# Altium integrated library Rosenberger HSD.IntLib: 118 symbols (part 1 of 2) (continued)
## D4S12H-40MA5-B-EMITTER (continued)
HSD Straight Plug, Pin in Paste, Coding B (White), Up to 5 GBit/s Per Pair, Emitter Side; PartNumber: D4S12H-40MA5-B-EMITTER; Design Note 1: Footprint in library is a generic example - only application specific footprint delivers High Performance; Design Note 2: A HSD 1-to-1 connection always needs an Emitter AND Receiver symbol, because the cable has a A->B direction, the pinning must be crossed.; DatasheetVersion: a00; PackageVersion: a00; PackageReference: D4S12H-40MA5-B; PackageDescription: HSD Straight Plug, 12 x 14.15 x 15.45 mm; Coding: B (White); Mounting Technology: Pin-in-Paste; ComponentLink1Description: Manufacturer URL; ComponentLink1URL: http://www.rosenberger.de; ComponentLink2Description: Datasheet; ComponentLink2URL: http://rosenberger.de/ok/images/documents/db/D4S12H-40MA5-Y.pdf; ComponentLink3Description: Package Specification; ComponentLink3URL: http://rosenberger.de/ok/images/documents/db/D4S12H-40MA5-Y.pdf; ComponentLink4Description: Series Overview / Design Note; ComponentLink4URL: http://rosenberger.de/ok/images/documents/spez/hsd.pdf; ComponentLink5Description: Webshop / RFQ; ComponentLink5URL: http://www.rosenberger.com/en/contact/sales/
footprint ROS-D4S12H-40MA5-B_V (HSD Straight Plug, 12x14.15x15.45mm, Rosenberger Recommended)
pins: 1, 2, 3, 4, MH
text: Pair A; Pair B

## D4S12H-40MA5-B-RECEIVER
designator P?
HSD Straight Plug, Pin in Paste, Coding B (White), Up to 5 GBit/s Per Pair, Receiver Side; PartNumber: D4S12H-40MA5-B-RECEIVER; Design Note 1: Footprint in library is a generic example - only application specific footprint delivers High Performance; Design Note 2: A HSD 1-to-1 connection always needs an Emitter AND Receiver symbol, because the cable has a A->B direction, the pinning must be crossed.; DatasheetVersion: a00; PackageVersion: a00; PackageReference: D4S12H-40MA5-B; PackageDescription: HSD Straight Plug, 12 x 14.15 x 15.45 mm; Coding: B (White); Mounting Technology: Pin-in-Paste; ComponentLink1Description: Manufacturer URL; ComponentLink1URL: http://www.rosenberger.de; ComponentLink2Description: Datasheet; ComponentLink2URL: http://rosenberger.de/ok/images/documents/db/D4S12H-40MA5-Y.pdf; ComponentLink3Description: Package Specification; ComponentLink3URL: http://rosenberger.de/ok/images/documents/db/D4S12H-40MA5-Y.pdf; ComponentLink4Description: Series Overview / Design Note; ComponentLink4URL: http://rosenberger.de/ok/images/documents/spez/hsd.pdf; ComponentLink5Description: Webshop / RFQ; ComponentLink5URL: http://www.rosenberger.com/en/contact/sales/
footprint ROS-D4S12H-40MA5-B_V (HSD Straight Plug, 12x14.15x15.45mm, Rosenberger Recommended)
pins: 1, 2, 3, 4, MH
text: Pair A; Pair B

## D4S12H-40MA5-C-EMITTER
designator P?
HSD Straight Plug, Pin in Paste, Coding C (Blue), Up to 5 GBit/s Per Pair, Emitter Side; PartNumber: D4S12H-40MA5-C-EMITTER; Design Note 1: Footprint in library is a generic example - only application specific footprint delivers High Performance; Design Note 2: A HSD 1-to-1 connection always needs an Emitter AND Receiver symbol, because the cable has a A->B direction, the pinning must be crossed.; DatasheetVersion: a00; PackageVersion: a00; PackageReference: D4S12H-40MA5-C; PackageDescription: HSD Straight Plug, 12 x 14.15 x 15.45 mm; Coding: C (Blue); Mounting Technology: Pin-in-Paste; ComponentLink1Description: Manufacturer URL; ComponentLink1URL: http://www.rosenberger.de; ComponentLink2Description: Datasheet; ComponentLink2URL: http://rosenberger.de/ok/images/documents/db/D4S12H-40MA5-Y.pdf; ComponentLink3Description: Package Specification; ComponentLink3URL: http://rosenberger.de/ok/images/documents/db/D4S12H-40MA5-Y.pdf; ComponentLink4Description: Series Overview / Design Note; ComponentLink4URL: http://rosenberger.de/ok/images/documents/spez/hsd.pdf; ComponentLink5Description: Webshop / RFQ; ComponentLink5URL: http://www.rosenberger.com/en/contact/sales/
footprint ROS-D4S12H-40MA5-C_V (HSD Straight Plug, 12x14.15x15.45mm, Rosenberger Recommended)
pins: 1, 2, 3, 4, MH
text: Pair A; Pair B

## D4S12H-40MA5-C-RECEIVER
designator P?
HSD Straight Plug, Pin in Paste, Coding C (Blue), Up to 5 GBit/s Per Pair, Receiver Side; PartNumber: D4S12H-40MA5-C-RECEIVER; Design Note 1: Footprint in library is a generic example - only application specific footprint delivers High Performance; Design Note 2: A HSD 1-to-1 connection always needs an Emitter AND Receiver symbol, because the cable has a A->B direction, the pinning must be crossed.; DatasheetVersion: a00; PackageVersion: a00; PackageReference: D4S12H-40MA5-C; PackageDescription: HSD Straight Plug, 12 x 14.15 x 15.45 mm; Coding: C (Blue); Mounting Technology: Pin-in-Paste; ComponentLink1Description: Manufacturer URL; ComponentLink1URL: http://www.rosenberger.de; ComponentLink2Description: Datasheet; ComponentLink2URL: http://rosenberger.de/ok/images/documents/db/D4S12H-40MA5-Y.pdf; ComponentLink3Description: Package Specification; ComponentLink3URL: http://rosenberger.de/ok/images/documents/db/D4S12H-40MA5-Y.pdf; ComponentLink4Description: Series Overview / Design Note; ComponentLink4URL: http://rosenberger.de/ok/images/documents/spez/hsd.pdf; ComponentLink5Description: Webshop / RFQ; ComponentLink5URL: http://www.rosenberger.com/en/contact/sales/
footprint ROS-D4S12H-40MA5-C_V (HSD Straight Plug, 12x14.15x15.45mm, Rosenberger Recommended)
pins: 1, 2, 3, 4, MH
text: Pair A; Pair B

## D4S20G-400A5-A-EMITTER
designator P?
HSD Right Angle Plug, Coding A (Black), Up to 5 GBit/s Per Pair, Emitter Side; PartNumber: D4S20G-400A5-A-EMITTER; Design Note 1: Footprint in library is a generic example - only application specific footprint delivers High Performance; Design Note 2: A HSD 1-to-1 connection always needs an Emitter AND Receiver symbol, because the cable has a A->B direction, the pinning must be crossed.; DatasheetVersion: c00; PackageVersion: c00; PackageReference: D4S20G-400A5-A; PackageDescription: HSD Right Angle Plug, 27.2 x 12 x 10.6 mm; Coding: A (Black); Mounting Technology: Through Hole; ComponentLink1Description: Manufacturer URL; ComponentLink1URL: http://www.rosenberger.de; ComponentLink2Description: Datasheet; ComponentLink2URL: http://rosenberger.de/ok/images/documents/db/D4S20G-400A5-Y.pdf; ComponentLink3Description: Package Specification; ComponentLink3URL: http://rosenberger.de/ok/images/documents/db/D4S20G-400A5-Y.pdf; ComponentLink4Description: Series Overview / Design Note; ComponentLink4URL: http://rosenberger.de/ok/images/documents/spez/hsd.pdf; ComponentLink5Description: Webshop / RFQ; ComponentLink5URL: http://www.rosenberger.com/en/contact/sales/
footprint ROS-D4S20G-400A5-A_V (HSD Right Angle Plug, 27.2x12x10.6mm, Rosenberger Recommended)
pins: 1, 2, 3, 4, MH
text: Pair A; Pair B

## D4S20G-400A5-A-RECEIVER
designator P?
HSD Right Angle Plug, Coding A (Black), Up to 5 GBit/s Per Pair, Receiver Side; PartNumber: D4S20G-400A5-A-RECEIVER; Design Note 1: Footprint in library is a generic example - only application specific footprint delivers High Performance; Design Note 2: A HSD 1-to-1 connection always needs an Emitter AND Receiver symbol, because the cable has a A->B direction, the pinning must be crossed.; DatasheetVersion: c00; PackageVersion: c00; PackageReference: D4S20G-400A5-A; PackageDescription: HSD Right Angle Plug, 27.2 x 12 x 10.6 mm; Coding: A (Black); Mounting Technology: Through Hole; ComponentLink1Description: Manufacturer URL; ComponentLink1URL: http://www.rosenberger.de; ComponentLink2Description: Datasheet; ComponentLink2URL: http://rosenberger.de/ok/images/documents/db/D4S20G-400A5-Y.pdf; ComponentLink3Description: Package Specification; ComponentLink3URL: http://rosenberger.de/ok/images/documents/db/D4S20G-400A5-Y.pdf; ComponentLink4Description: Series Overview / Design Note; ComponentLink4URL: http://rosenberger.de/ok/images/documents/spez/hsd.pdf; ComponentLink5Description: Webshop / RFQ; ComponentLink5URL: http://www.rosenberger.com/en/contact/sales/
footprint ROS-D4S20G-400A5-A_V (HSD Right Angle Plug, 27.2x12x10.6mm, Rosenberger Recommended)
pins: 1, 2, 3, 4, MH
text: Pair A; Pair B

## D4S20G-400A5-B-EMITTER
designator P?
HSD Right Angle Plug, Coding B (White), Up to 5 GBit/s Per Pair, Emitter Side; PartNumber: D4S20G-400A5-B-EMITTER; Design Note 1: Footprint in library is a generic example - only application specific footprint delivers High Performance; Design Note 2: A HSD 1-to-1 connection always needs an Emitter AND Receiver symbol, because the cable has a A->B direction, the pinning must be crossed.; DatasheetVersion: c00; PackageVersion: c00; PackageReference: D4S20G-400A5-B; PackageDescription: HSD Right Angle Plug, 27.2 x 12 x 10.6 mm; Coding: B (White); Mounting Technology: Through Hole; ComponentLink1Description: Manufacturer URL; ComponentLink1URL: http://www.rosenberger.de; ComponentLink2Description: Datasheet; ComponentLink2URL: http://rosenberger.de/ok/images/documents/db/D4S20G-400A5-Y.pdf; ComponentLink3Description: Package Specification; ComponentLink3URL: http://rosenberger.de/ok/images/documents/db/D4S20G-400A5-Y.pdf; ComponentLink4Description: Series Overview / Design Note; ComponentLink4URL: http://rosenberger.de/ok/images/documents/spez/hsd.pdf; ComponentLink5Description: Webshop / RFQ; ComponentLink5URL: http://www.rosenberger.com/en/contact/sales/
footprint ROS-D4S20G-400A5-B_V (HSD Right Angle Plug, 27.2x12x10.6mm, Rosenberger Recommended)
pins: 1, 2, 3, 4, MH
text: Pair A; Pair B

## D4S20G-400A5-B-RECEIVER
designator P?
HSD Right Angle Plug, Coding B (White), Up to 5 GBit/s Per Pair, Receiver Side; PartNumber: D4S20G-400A5-B-RECEIVER; Design Note 1: Footprint in library is a generic example - only application specific footprint delivers High Performance; Design Note 2: A HSD 1-to-1 connection always needs an Emitter AND Receiver symbol, because the cable has a A->B direction, the pinning must be crossed.; DatasheetVersion: c00; PackageVersion: c00; PackageReference: D4S20G-400A5-B; PackageDescription: HSD Right Angle Plug, 27.2 x 12 x 10.6 mm; Coding: B (White); Mounting Technology: Through Hole; ComponentLink1Description: Manufacturer URL; ComponentLink1URL: http://www.rosenberger.de; ComponentLink2Description: Datasheet; ComponentLink2URL: http://rosenberger.de/ok/images/documents/db/D4S20G-400A5-Y.pdf; ComponentLink3Description: Package Specification; ComponentLink3URL: http://rosenberger.de/ok/images/documents/db/D4S20G-400A5-Y.pdf; ComponentLink4Description: Series Overview / Design Note; ComponentLink4URL: http://rosenberger.de/ok/images/documents/spez/hsd.pdf; ComponentLink5Description: Webshop / RFQ; ComponentLink5URL: http://www.rosenberger.com/en/contact/sales/
footprint ROS-D4S20G-400A5-B_V (HSD Right Angle Plug, 27.2x12x10.6mm, Rosenberger Recommended)
pins: 1, 2, 3, 4, MH
text: Pair A; Pair B

## D4S20G-400A5-C-EMITTER
designator P?
HSD Right Angle Plug, Coding C (Blue), Up to 5 GBit/s Per Pair, Emitter Side; PartNumber: D4S20G-400A5-C-EMITTER; Design Note 1: Footprint in library is a generic example - only application specific footprint delivers High Performance; Design Note 2: A HSD 1-to-1 connection always needs an Emitter AND Receiver symbol, because the cable has a A->B direction, the pinning must be crossed.; DatasheetVersion: c00; PackageVersion: c00; PackageReference: D4S20G-400A5-C; PackageDescription: HSD Right Angle Plug, 27.2 x 12 x 10.6 mm; Coding: C (Blue); Mounting Technology: Through Hole; ComponentLink1Description: Manufacturer URL; ComponentLink1URL: http://www.rosenberger.de; ComponentLink2Description: Datasheet; ComponentLink2URL: http://rosenberger.de/ok/images/documents/db/D4S20G-400A5-Y.pdf; ComponentLink3Description: Package Specification; ComponentLink3URL: http://rosenberger.de/ok/images/documents/db/D4S20G-400A5-Y.pdf; ComponentLink4Description: Series Overview / Design Note; ComponentLink4URL: http://rosenberger.de/ok/images/documents/spez/hsd.pdf; ComponentLink5Description: Webshop / RFQ; ComponentLink5URL: http://www.rosenberger.com/en/contact/sales/
footprint ROS-D4S20G-400A5-C_V (HSD Right Angle Plug, 27.2x12x10.6mm, Rosenberger Recommended)
pins: 1, 2, 3, 4, MH
text: Pair A; Pair B

## D4S20G-400A5-C-RECEIVER
designator P?
HSD Right Angle Plug, Coding C (Blue), Up to 5 GBit/s Per Pair, Receiver Side; PartNumber: D4S20G-400A5-C-RECEIVER; Design Note 1: Footprint in library is a generic example - only application specific footprint delivers High Performance; Design Note 2: A HSD 1-to-1 connection always needs an Emitter AND Receiver symbol, because the cable has a A->B direction, the pinning must be crossed.; DatasheetVersion: c00; PackageVersion: c00; PackageReference: D4S20G-400A5-C; PackageDescription: HSD Right Angle Plug, 27.2 x 12 x 10.6 mm; Coding: C (Blue); Mounting Technology: Through Hole; ComponentLink1Description: Manufacturer URL; ComponentLink1URL: http://www.rosenberger.de; ComponentLink2Description: Datasheet; ComponentLink2URL: http://rosenberger.de/ok/images/documents/db/D4S20G-400A5-Y.pdf; ComponentLink3Description: Package Specification; ComponentLink3URL: http://rosenberger.de/ok/images/documents/db/D4S20G-400A5-Y.pdf; ComponentLink4Description: Series Overview / Design Note; ComponentLink4URL: http://rosenberger.de/ok/images/documents/spez/hsd.pdf; ComponentLink5Description: Webshop / RFQ; ComponentLink5URL: http://www.rosenberger.com/en/contact/sales/
footprint ROS-D4S20G-400A5-C_V (HSD Right Angle Plug, 27.2x12x10.6mm, Rosenberger Recommended)
pins: 1, 2, 3, 4, MH
text: Pair A; Pair B

## D4S20G-400A5-D-EMITTER
designator P?
HSD Right Angle Plug, Coding D (Bordeaux), Up to 5 GBit/s Per Pair, Emitter Side; PartNumber: D4S20G-400A5-D-EMITTER; Design Note 1: Footprint in library is a generic example - only application specific footprint delivers High Performance; Design Note 2: A HSD 1-to-1 connection always needs an Emitter AND Receiver symbol, because the cable has a A->B direction, the pinning must be crossed.; DatasheetVersion: c00; PackageVersion: c00; PackageReference: D4S20G-400A5-D; PackageDescription: HSD Right Angle Plug, 27.2 x 12 x 10.6 mm; Coding: D (Bordeaux); Mounting Technology: Through Hole; ComponentLink1Description: Manufacturer URL; ComponentLink1URL: http://www.rosenberger.de; ComponentLink2Description: Datasheet; ComponentLink2URL: http://rosenberger.de/ok/images/documents/db/D4S20G-400A5-Y.pdf; ComponentLink3Description: Package Specification; ComponentLink3URL: http://rosenberger.de/ok/images/documents/db/D4S20G-400A5-Y.pdf; ComponentLink4Description: Series Overview / Design Note; ComponentLink4URL: http://rosenberger.de/ok/images/documents/spez/hsd.pdf; ComponentLink5Description: Webshop / RFQ; ComponentLink5URL: http://www.rosenberger.com/en/contact/sales/
footprint ROS-D4S20G-400A5-D_V (HSD Right Angle Plug, 27.2x12x10.6mm, Rosenberger Recommended)
pins: 1, 2, 3, 4, MH
text: Pair A; Pair B

## D4S20G-400A5-D-RECEIVER
designator P?
HSD Right Angle Plug, Coding D (Bordeaux), Up to 5 GBit/s Per Pair, Receiver Side; PartNumber: D4S20G-400A5-D-RECEIVER; Design Note 1: Footprint in library is a generic example - only application specific footprint delivers High Performance; Design Note 2: A HSD 1-to-1 connection always needs an Emitter AND Receiver symbol, because the cable has a A->B direction, the pinning must be crossed.; DatasheetVersion: c00; PackageVersion: c00; PackageReference: D4S20G-400A5-D; PackageDescription: HSD Right Angle Plug, 27.2 x 12 x 10.6 mm; Coding: D (Bordeaux); Mounting Technology: Through Hole; ComponentLink1Description: Manufacturer URL; ComponentLink1URL: http://www.rosenberger.de; ComponentLink2Description: Datasheet; ComponentLink2URL: http://rosenberger.de/ok/images/documents/db/D4S20G-400A5-Y.pdf; ComponentLink3Description: Package Specification; ComponentLink3URL: http://rosenberger.de/ok/images/documents/db/D4S20G-400A5-Y.pdf; ComponentLink4Description: Series Overview / Design Note; ComponentLink4URL: http://rosenberger.de/ok/images/documents/spez/hsd.pdf; ComponentLink5Description: Webshop / RFQ; ComponentLink5URL: http://www.rosenberger.com/en/contact/sales/
footprint ROS-D4S20G-400A5-D_V (HSD Right Angle Plug, 27.2x12x10.6mm, Rosenberger Recommended)
pins: 1, 2, 3, 4, MH
text: Pair A; Pair B

## D4S20G-400A5-E-EMITTER
designator P?
HSD Right Angle Plug, Coding E (Green), Up to 5 GBit/s Per Pair, Emitter Side; PartNumber: D4S20G-400A5-E-EMITTER; Design Note 1: Footprint in library is a generic example - only application specific footprint delivers High Performance; Design Note 2: A HSD 1-to-1 connection always needs an Emitter AND Receiver symbol, because the cable has a A->B direction, the pinning must be crossed.; DatasheetVersion: c00; PackageVersion: c00; PackageReference: D4S20G-400A5-E; PackageDescription: HSD Right Angle Plug, 27.2 x 12 x 10.6 mm; Coding: E (Green); Mounting Technology: Through Hole; ComponentLink1Description: Manufacturer URL; ComponentLink1URL: http://www.rosenberger.de; ComponentLink2Description: Datasheet; ComponentLink2URL: http://rosenberger.de/ok/images/documents/db/D4S20G-400A5-Y.pdf; ComponentLink3Description: Package Specification; ComponentLink3URL: http://rosenberger.de/ok/images/documents/db/D4S20G-400A5-Y.pdf; ComponentLink4Description: Series Overview / Design Note; ComponentLink4URL: http://rosenberger.de/ok/images/documents/spez/hsd.pdf; ComponentLink5Description: Webshop / RFQ; ComponentLink5URL: http://www.rosenberger.com/en/contact/sales/
footprint ROS-D4S20G-400A5-E_V (HSD Right Angle Plug, 27.2x12x10.6mm, Rosenberger Recommended)
pins: 1, 2, 3, 4, MH
text: Pair A; Pair B

## D4S20G-400A5-E-RECEIVER
designator P?
HSD Right Angle Plug, Coding E (Green), Up to 5 GBit/s Per Pair, Receiver Side; PartNumber: D4S20G-400A5-E-RECEIVER; Design Note 1: Footprint in library is a generic example - only application specific footprint delivers High Performance; Design Note 2: A HSD 1-to-1 connection always needs an Emitter AND Receiver symbol, because the cable has a A->B direction, the pinning must be crossed.; DatasheetVersion: c00; PackageVersion: c00; PackageReference: D4S20G-400A5-E; PackageDescription: HSD Right Angle Plug, 27.2 x 12 x 10.6 mm; Coding: E (Green); Mounting Technology: Through Hole; ComponentLink1Description: Manufacturer URL; ComponentLink1URL: http://www.rosenberger.de; ComponentLink2Description: Datasheet; ComponentLink2URL: http://rosenberger.de/ok/images/documents/db/D4S20G-400A5-Y.pdf; ComponentLink3Description: Package Specification; ComponentLink3URL: http://rosenberger.de/ok/images/documents/db/D4S20G-400A5-Y.pdf; ComponentLink4Description: Series Overview / Design Note; ComponentLink4URL: http://rosenberger.de/ok/images/documents/spez/hsd.pdf; ComponentLink5Description: Webshop / RFQ; ComponentLink5URL: http://www.rosenberger.com/en/contact/sales/
footprint ROS-D4S20G-400A5-E_V (HSD Right Angle Plug, 27.2x12x10.6mm, Rosenberger Recommended)
pins: 1, 2, 3, 4, MH
text: Pair A; Pair B

## D4S20G-400A5-F-EMITTER
designator P?
HSD Right Angle Plug, Coding F (Brown), Up to 5 GBit/s Per Pair, Emitter Side; PartNumber: D4S20G-400A5-F-EMITTER; Design Note 1: Footprint in library is a generic example - only application specific footprint delivers High Performance; Design Note 2: A HSD 1-to-1 connection always needs an Emitter AND Receiver symbol, because the cable has a A->B direction, the pinning must be crossed.; DatasheetVersion: c00; PackageVersion: c00; PackageReference: D4S20G-400A5-F; PackageDescription: HSD Right Angle Plug, 27.2 x 12 x 10.6 mm; Coding: F (Brown); Mounting Technology: Through Hole; ComponentLink1Description: Manufacturer URL; ComponentLink1URL: http://www.rosenberger.de; ComponentLink2Description: Datasheet; ComponentLink2URL: http://rosenberger.de/ok/images/documents/db/D4S20G-400A5-Y.pdf; ComponentLink3Description: Package Specification; ComponentLink3URL: http://rosenberger.de/ok/images/documents/db/D4S20G-400A5-Y.pdf; ComponentLink4Description: Series Overview / Design Note; ComponentLink4URL: http://rosenberger.de/ok/images/documents/spez/hsd.pdf; ComponentLink5Description: Webshop / RFQ; ComponentLink5URL: http://www.rosenberger.com/en/contact/sales/
footprint ROS-D4S20G-400A5-F_V (HSD Right Angle Plug, 27.2x12x10.6mm, Rosenberger Recommended)
pins: 1, 2, 3, 4, MH
text: Pair A; Pair B

## D4S20G-400A5-F-RECEIVER
designator P?
HSD Right Angle Plug, Coding F (Brown), Up to 5 GBit/s Per Pair, Receiver Side; PartNumber: D4S20G-400A5-F-RECEIVER; Design Note 1: Footprint in library is a generic example - only application specific footprint delivers High Performance; Design Note 2: A HSD 1-to-1 connection always needs an Emitter AND Receiver symbol, because the cable has a A->B direction, the pinning must be crossed.; DatasheetVersion: c00; PackageVersion: c00; PackageReference: D4S20G-400A5-F; PackageDescription: HSD Right Angle Plug, 27.2 x 12 x 10.6 mm; Coding: F (Brown); Mounting Technology: Through Hole; ComponentLink1Description: Manufacturer URL; ComponentLink1URL: http://www.rosenberger.de; ComponentLink2Description: Datasheet; ComponentLink2URL: http://rosenberger.de/ok/images/documents/db/D4S20G-400A5-Y.pdf; ComponentLink3Description: Package Specification; ComponentLink3URL: http://rosenberger.de/ok/images/documents/db/D4S20G-400A5-Y.pdf; ComponentLink4Description: Series Overview / Design Note; ComponentLink4URL: http://rosenberger.de/ok/images/documents/spez/hsd.pdf; ComponentLink5Description: Webshop / RFQ; ComponentLink5URL: http://www.rosenberger.com/en/contact/sales/
footprint ROS-D4S20G-400A5-F_V (HSD Right Angle Plug, 27.2x12x10.6mm, Rosenberger Recommended)
pins: 1, 2, 3, 4, MH
text: Pair A; Pair B

## D4S20G-400A5-O-EMITTER
designator P?
HSD Right Angle Plug, Coding O (Light Green), Up to 5 GBit/s Per Pair, Emitter Side; PartNumber: D4S20G-400A5-O-EMITTER; Design Note 1: Footprint in library is a generic example - only application specific footprint delivers High Performance; Design Note 2: A HSD 1-to-1 connection always needs an Emitter AND Receiver symbol, because the cable has a A->B direction, the pinning must be crossed.; DatasheetVersion: c00; PackageVersion: c00; PackageReference: D4S20G-400A5-O; PackageDescription: HSD Right Angle Plug, 27.2 x 12 x 10.6 mm; Coding: O (Light Green); Mounting Technology: Through Hole; ComponentLink1Description: Manufacturer URL; ComponentLink1URL: http://www.rosenberger.de; ComponentLink2Description: Datasheet; ComponentLink2URL: http://rosenberger.de/ok/images/documents/db/D4S20G-400A5-Y.pdf; ComponentLink3Description: Package Specification; ComponentLink3URL: http://rosenberger.de/ok/images/documents/db/D4S20G-400A5-Y.pdf; ComponentLink4Description: Series Overview / Design Note; ComponentLink4URL: http://rosenberger.de/ok/images/documents/spez/hsd.pdf; ComponentLink5Description: Webshop / RFQ; ComponentLink5URL: http://www.rosenberger.com/en/contact/sales/
footprint ROS-D4S20G-400A5-O_V (HSD Right Angle Plug, 27.2x12x10.6mm, Rosenberger Recommended)
pins: 1, 2, 3, 4, MH
text: Pair A; Pair B

## D4S20G-400A5-O-RECEIVER
designator P?
HSD Right Angle Plug, Coding O (Light Green), Up to 5 GBit/s Per Pair, Receiver Side; PartNumber: D4S20G-400A5-O-RECEIVER; Design Note 1: Footprint in library is a generic example - only application specific footprint delivers High Performance; Design Note 2: A HSD 1-to-1 connection always needs an Emitter AND Receiver symbol, because the cable has a A->B direction, the pinning must be crossed.; DatasheetVersion: c00; PackageVersion: c00; PackageReference: D4S20G-400A5-O; PackageDescription: HSD Right Angle Plug, 27.2 x 12 x 10.6 mm; Coding: O (Light Green); Mounting Technology: Through Hole; ComponentLink1Description: Manufacturer URL; ComponentLink1URL: http://www.rosenberger.de; ComponentLink2Description: Datasheet; ComponentLink2URL: http://rosenberger.de/ok/images/documents/db/D4S20G-400A5-Y.pdf; ComponentLink3Description: Package Specification; ComponentLink3URL: http://rosenberger.de/ok/images/documents/db/D4S20G-400A5-Y.pdf; ComponentLink4Description: Series Overview / Design Note; ComponentLink4URL: http://rosenberger.de/ok/images/documents/spez/hsd.pdf; ComponentLink5Description: Webshop / RFQ; ComponentLink5URL: http://www.rosenberger.com/en/contact/sales/
footprint ROS-D4S20G-400A5-O_V (HSD Right Angle Plug, 27.2x12x10.6mm, Rosenberger Recommended)
pins: 1, 2, 3, 4, MH
text: Pair A; Pair B

## D4S20G-400A5-Z-EMITTER
designator P?
HSD Right Angle Plug, Coding Z (Waterblue), Up to 5 GBit/s Per Pair, Emitter Side; PartNumber: D4S20G-400A5-Z-EMITTER; Design Note 1: Footprint in library is a generic example - only application specific footprint delivers High Performance; Design Note 2: A HSD 1-to-1 connection always needs an Emitter AND Receiver symbol, because the cable has a A->B direction, the pinning must be crossed.; DatasheetVersion: c00; PackageVersion: c00; PackageReference: D4S20G-400A5-Z; PackageDescription: HSD Right Angle Plug, 27.2 x 12 x 10.6 mm; Coding: Z (Waterblue); Mounting Technology: Through Hole; ComponentLink1Description: Manufacturer URL; ComponentLink1URL: http://www.rosenberger.de; ComponentLink2Description: Datasheet; ComponentLink2URL: http://rosenberger.de/ok/images/documents/db/D4S20G-400A5-Y.pdf; ComponentLink3Description: Package Specification; ComponentLink3URL: http://rosenberger.de/ok/images/documents/db/D4S20G-400A5-Y.pdf; ComponentLink4Description: Series Overview / Design Note; ComponentLink4URL: http://rosenberger.de/ok/images/documents/spez/hsd.pdf; ComponentLink5Description: Webshop / RFQ; ComponentLink5URL: http://www.rosenberger.com/en/contact/sales/
footprint ROS-D4S20G-400A5-Z_V (HSD Right Angle Plug, 27.2x12x13.5mm, Rosenberger Recommended)
pins: 1, 2, 3, 4, MH
text: Pair A; Pair B

## D4S20G-400A5-Z-RECEIVER
designator P?
HSD Right Angle Plug, Coding Z (Waterblue), Up to 5 GBit/s Per Pair, Receiver Side; PartNumber: D4S20G-400A5-Z-RECEIVER; Design Note 1: Footprint in library is a generic example - only application specific footprint delivers High Performance; Design Note 2: A HSD 1-to-1 connection always needs an Emitter AND Receiver symbol, because the cable has a A->B direction, the pinning must be crossed.; DatasheetVersion: c00; PackageVersion: c00; PackageReference: D4S20G-400A5-Z; PackageDescription: HSD Right Angle Plug, 27.2 x 12 x 10.6 mm; Coding: Z (Waterblue); Mounting Technology: Through Hole; ComponentLink1Description: Manufacturer URL; ComponentLink1URL: http://www.rosenberger.de; ComponentLink2Description: Datasheet; ComponentLink2URL: http://rosenberger.de/ok/images/documents/db/D4S20G-400A5-Y.pdf; ComponentLink3Description: Package Specification; ComponentLink3URL: http://rosenberger.de/ok/images/documents/db/D4S20G-400A5-Y.pdf; ComponentLink4Description: Series Overview / Design Note; ComponentLink4URL: http://rosenberger.de/ok/images/documents/spez/hsd.pdf; ComponentLink5Description: Webshop / RFQ; ComponentLink5URL: http://www.rosenberger.com/en/contact/sales/
footprint ROS-D4S20G-400A5-Z_V (HSD Right Angle Plug, 27.2x12x13.5mm, Rosenberger Recommended)
pins: 1, 2, 3, 4, MH
text: Pair A; Pair B

## D4S20L-40MA5-A-EMITTER
designator P?
HSD Right Angle Plug, Edge Mount Pin in Paste, Coding A (Black), Up to 5 GBit/s Per Pair, Emitter Side; PartNumber: D4S20L-40MA5-A-EMITTER; Design Note 1: Footprint in library is a generic example - only application specific footprint delivers High Performance; Design Note 2: A HSD 1-to-1 connection always needs an Emitter AND Receiver symbol, because the cable has a A->B direction, the pinning must be crossed.; DatasheetVersion: d00; PackageVersion: d00; PackageReference: D4S20L-40MA5-A; PackageDescription: HSD Right Angle Plug, Edge Mount Pin in Paste, 27.3 x 12 x 6.95 mm; Coding: A (Black); Mounting Technology: Pin-in-Paste; ComponentLink1Description: Manufacturer URL; ComponentLink1URL: http://www.rosenberger.de; ComponentLink2Description: Datasheet; ComponentLink2URL: http://rosenberger.de/ok/images/documents/db/D4S20L-40MA5-Y.pdf; ComponentLink3Description: Package Specification; ComponentLink3URL: http://rosenberger.de/ok/images/documents/db/D4S20L-40MA5-Y.pdf; ComponentLink4Description: Series Overview / Design Note; ComponentLink4URL: http://rosenberger.de/ok/images/documents/spez/hsd.pdf; ComponentLink5Description: Webshop / RFQ; ComponentLink5URL: http://www.rosenberger.com/en/contact/sales/
footprint ROS-D4S20L-40MA5-A_V (HSD Right Angle Plug, Edge Mount Pin in Paste, 27.3x12x6.95mm, Rosenberger Recommended)
pins: 1, 2, 3, 4, MH
text: Pair A; Pair B

## D4S20L-40MA5-A-RECEIVER
designator P?
HSD Right Angle Plug, Edge Mount Pin in Paste, Coding A (Black), Up to 5 GBit/s Per Pair, Receiver Side; PartNumber: D4S20L-40MA5-A-RECEIVER; Design Note 1: Footprint in library is a generic example - only application specific footprint delivers High Performance; Design Note 2: A HSD 1-to-1 connection always needs an Emitter AND Receiver symbol, because the cable has a A->B direction, the pinning must be crossed.; DatasheetVersion: d00; PackageVersion: d00; PackageReference: D4S20L-40MA5-A; PackageDescription: HSD Right Angle Plug, Edge Mount Pin in Paste, 27.3 x 12 x 6.95 mm; Coding: A (Black); Mounting Technology: Pin-in-Paste; ComponentLink1Description: Manufacturer URL; ComponentLink1URL: http://www.rosenberger.de; ComponentLink2Description: Datasheet; ComponentLink2URL: http://rosenberger.de/ok/images/documents/db/D4S20L-40MA5-Y.pdf; ComponentLink3Description: Package Specification; ComponentLink3URL: http://rosenberger.de/ok/images/documents/db/D4S20L-40MA5-Y.pdf; ComponentLink4Description: Series Overview / Design Note; ComponentLink4URL: http://rosenberger.de/ok/images/documents/spez/hsd.pdf; ComponentLink5Description: Webshop / RFQ; ComponentLink5URL: http://www.rosenberger.com/en/contact/sales/
footprint ROS-D4S20L-40MA5-A_V (HSD Right Angle Plug, Edge Mount Pin in Paste, 27.3x12x6.95mm, Rosenberger Recommended)
pins: 1, 2, 3, 4, MH
text: Pair A; Pair B

## D4S20L-40MA5-B-EMITTER
designator P?
HSD Right Angle Plug, Edge Mount Pin in Paste, Coding B (White), Up to 5 GBit/s Per Pair, Emitter Side; PartNumber: D4S20L-40MA5-B-EMITTER; Design Note 1: Footprint in library is a generic example - only application specific footprint delivers High Performance; Design Note 2: A HSD 1-to-1 connection always needs an Emitter AND Receiver symbol, because the cable has a A->B direction, the pinning must be crossed.; DatasheetVersion: d00; PackageVersion: d00; PackageReference: D4S20L-40MA5-B; PackageDescription: HSD Right Angle Plug, Edge Mount Pin in Paste, 27.3 x 12 x 6.95 mm; Coding: B (White); Mounting Technology: Pin-in-Paste; ComponentLink1Description: Manufacturer URL; ComponentLink1URL: http://www.rosenberger.de; ComponentLink2Description: Datasheet; ComponentLink2URL: http://rosenberger.de/ok/images/documents/db/D4S20L-40MA5-Y.pdf; ComponentLink3Description: Package Specification; ComponentLink3URL: http://rosenberger.de/ok/images/documents/db/D4S20L-40MA5-Y.pdf; ComponentLink4Description: Series Overview / Design Note; ComponentLink4URL: http://rosenberger.de/ok/images/documents/spez/hsd.pdf; ComponentLink5Description: Webshop / RFQ; ComponentLink5URL: http://www.rosenberger.com/en/contact/sales/
footprint ROS-D4S20L-40MA5-B_V (HSD Right Angle Plug, Edge Mount Pin in Paste, 27.3x12x6.95mm, Rosenberger Recommended)
pins: 1, 2, 3, 4, MH
text: Pair A; Pair B

## D4S20L-40MA5-B-RECEIVER
designator P?
HSD Right Angle Plug, Edge Mount Pin in Paste, Coding B (White), Up to 5 GBit/s Per Pair, Receiver Side; PartNumber: D4S20L-40MA5-B-RECEIVER; Design Note 1: Footprint in library is a generic example - only application specific footprint delivers High Performance; Design Note 2: A HSD 1-to-1 connection always needs an Emitter AND Receiver symbol, because the cable has a A->B direction, the pinning must be crossed.; DatasheetVersion: d00; PackageVersion: d00; PackageReference: D4S20L-40MA5-B; PackageDescription: HSD Right Angle Plug, Edge Mount Pin in Paste, 27.3 x 12 x 6.95 mm; Coding: B (White); Mounting Technology: Pin-in-Paste; ComponentLink1Description: Manufacturer URL; ComponentLink1URL: http://www.rosenberger.de; ComponentLink2Description: Datasheet; ComponentLink2URL: http://rosenberger.de/ok/images/documents/db/D4S20L-40MA5-Y.pdf; ComponentLink3Description: Package Specification; ComponentLink3URL: http://rosenberger.de/ok/images/documents/db/D4S20L-40MA5-Y.pdf; ComponentLink4Description: Series Overview / Design Note; ComponentLink4URL: http://rosenberger.de/ok/images/documents/spez/hsd.pdf; ComponentLink5Description: Webshop / RFQ; ComponentLink5URL: http://www.rosenberger.com/en/contact/sales/
footprint ROS-D4S20L-40MA5-B_V (HSD Right Angle Plug, Edge Mount Pin in Paste, 27.3x12x6.95mm, Rosenberger Recommended)
pins: 1, 2, 3, 4, MH
text: Pair A; Pair B

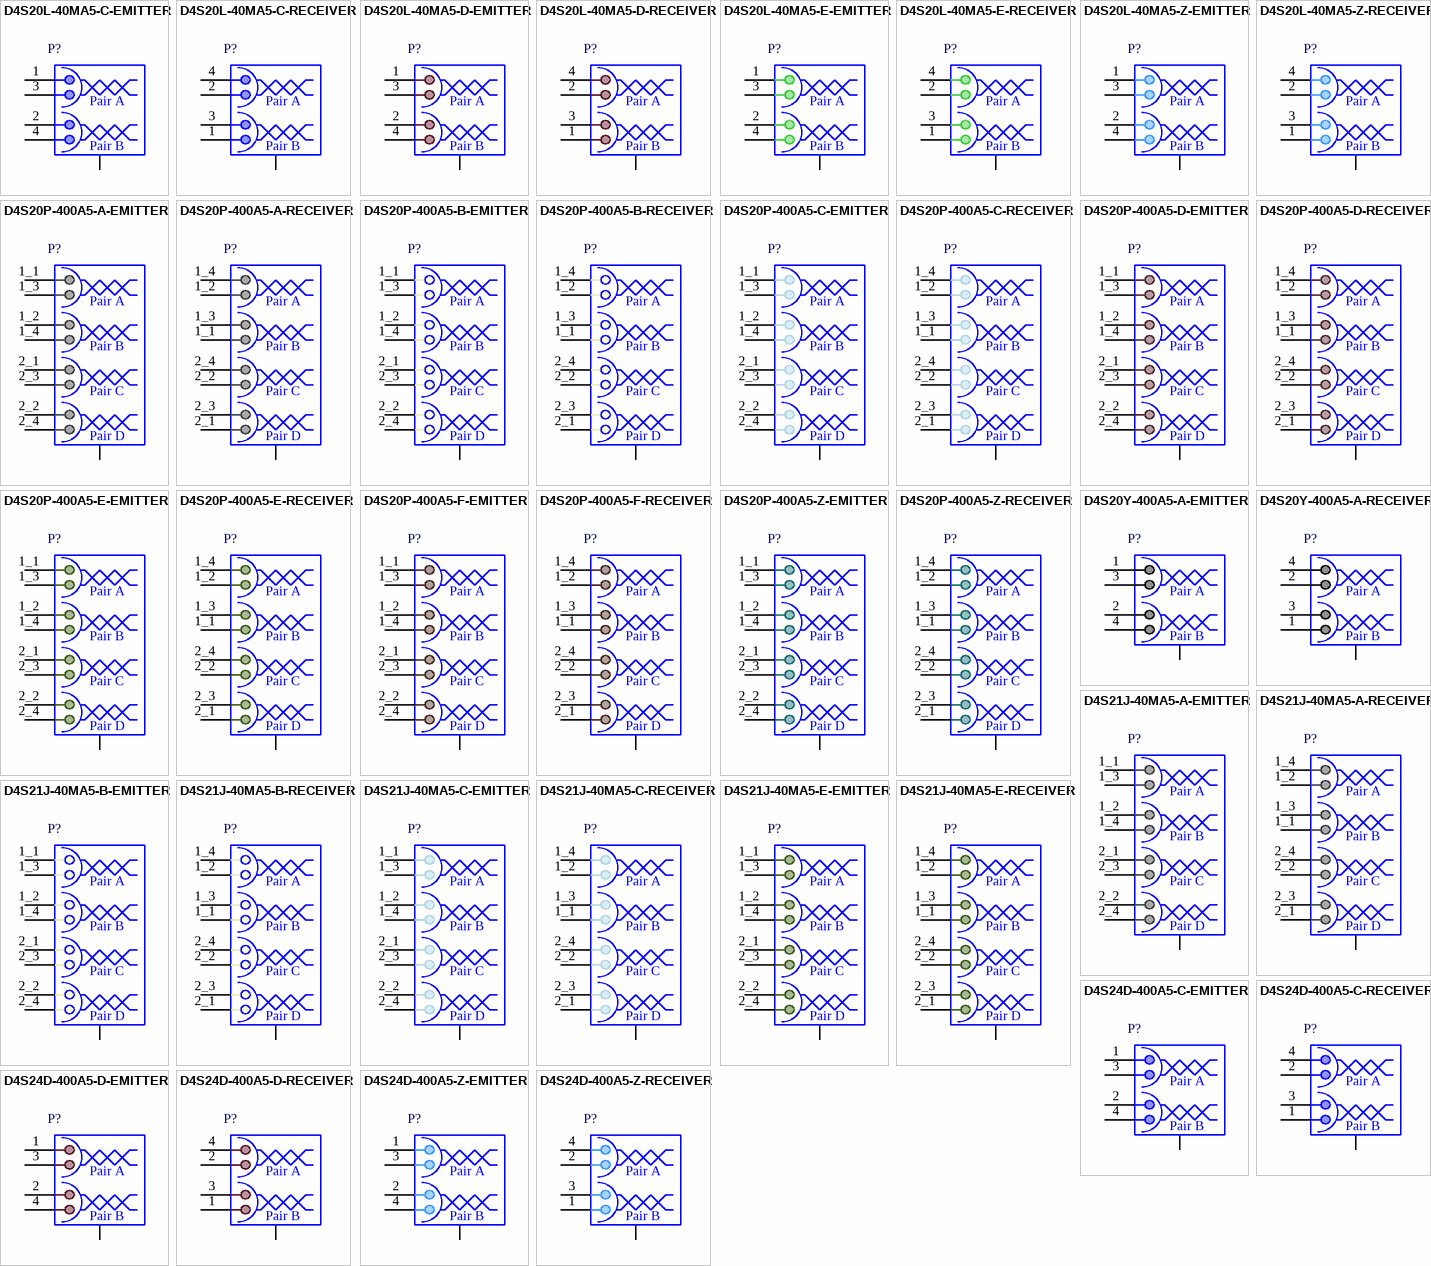
[diagram p2: symbols D4S20L-40MA5-C-EMITTER to D4S24D-400A5-Z-RECEIVER]

## D4S20L-40MA5-C-EMITTER
designator P?
HSD Right Angle Plug, Edge Mount Pin in Paste, Coding C (Blue), Up to 5 GBit/s Per Pair, Emitter Side; PartNumber: D4S20L-40MA5-C-EMITTER; Design Note 1: Footprint in library is a generic example - only application specific footprint delivers High Performance; Design Note 2: A HSD 1-to-1 connection always needs an Emitter AND Receiver symbol, because the cable has a A->B direction, the pinning must be crossed.; DatasheetVersion: d00; PackageVersion: d00; PackageReference: D4S20L-40MA5-C; PackageDescription: HSD Right Angle Plug, Edge Mount Pin in Paste, 27.3 x 12 x 6.95 mm; Coding: C (Blue); Mounting Technology: Pin-in-Paste; ComponentLink1Description: Manufacturer URL; ComponentLink1URL: http://www.rosenberger.de; ComponentLink2Description: Datasheet; ComponentLink2URL: http://rosenberger.de/ok/images/documents/db/D4S20L-40MA5-Y.pdf; ComponentLink3Description: Package Specification; ComponentLink3URL: http://rosenberger.de/ok/images/documents/db/D4S20L-40MA5-Y.pdf; ComponentLink4Description: Series Overview / Design Note; ComponentLink4URL: http://rosenberger.de/ok/images/documents/spez/hsd.pdf; ComponentLink5Description: Webshop / RFQ; ComponentLink5URL: http://www.rosenberger.com/en/contact/sales/
footprint ROS-D4S20L-40MA5-C_V (HSD Right Angle Plug, Edge Mount Pin in Paste, 27.3x12x6.95mm, Rosenberger Recommended)
pins: 1, 2, 3, 4, MH
text: Pair A; Pair B

## D4S20L-40MA5-C-RECEIVER
designator P?
HSD Right Angle Plug, Edge Mount Pin in Paste, Coding C (Blue), Up to 5 GBit/s Per Pair, Receiver Side; PartNumber: D4S20L-40MA5-C-RECEIVER; Design Note 1: Footprint in library is a generic example - only application specific footprint delivers High Performance; Design Note 2: A HSD 1-to-1 connection always needs an Emitter AND Receiver symbol, because the cable has a A->B direction, the pinning must be crossed.; DatasheetVersion: d00; PackageVersion: d00; PackageReference: D4S20L-40MA5-C; PackageDescription: HSD Right Angle Plug, Edge Mount Pin in Paste, 27.3 x 12 x 6.95 mm; Coding: C (Blue); Mounting Technology: Pin-in-Paste; ComponentLink1Description: Manufacturer URL; ComponentLink1URL: http://www.rosenberger.de; ComponentLink2Description: Datasheet; ComponentLink2URL: http://rosenberger.de/ok/images/documents/db/D4S20L-40MA5-Y.pdf; ComponentLink3Description: Package Specification; ComponentLink3URL: http://rosenberger.de/ok/images/documents/db/D4S20L-40MA5-Y.pdf; ComponentLink4Description: Series Overview / Design Note; ComponentLink4URL: http://rosenberger.de/ok/images/documents/spez/hsd.pdf; ComponentLink5Description: Webshop / RFQ; ComponentLink5URL: http://www.rosenberger.com/en/contact/sales/
footprint ROS-D4S20L-40MA5-C_V (HSD Right Angle Plug, Edge Mount Pin in Paste, 27.3x12x6.95mm, Rosenberger Recommended)
pins: 1, 2, 3, 4, MH
text: Pair A; Pair B

## D4S20L-40MA5-D-EMITTER
designator P?
HSD Right Angle Plug, Edge Mount Pin in Paste, Coding D (Bordeaux), Up to 5 GBit/s Per Pair, Emitter Side; PartNumber: D4S20L-40MA5-D-EMITTER; Design Note 1: Footprint in library is a generic example - only application specific footprint delivers High Performance; Design Note 2: A HSD 1-to-1 connection always needs an Emitter AND Receiver symbol, because the cable has a A->B direction, the pinning must be crossed.; DatasheetVersion: d00; PackageVersion: d00; PackageReference: D4S20L-40MA5-D; PackageDescription: HSD Right Angle Plug, Edge Mount Pin in Paste, 27.3 x 12 x 6.95 mm; Coding: D (Bordeaux); Mounting Technology: Pin-in-Paste; ComponentLink1Description: Manufacturer URL; ComponentLink1URL: http://www.rosenberger.de; ComponentLink2Description: Datasheet; ComponentLink2URL: http://rosenberger.de/ok/images/documents/db/D4S20L-40MA5-Y.pdf; ComponentLink3Description: Package Specification; ComponentLink3URL: http://rosenberger.de/ok/images/documents/db/D4S20L-40MA5-Y.pdf; ComponentLink4Description: Series Overview / Design Note; ComponentLink4URL: http://rosenberger.de/ok/images/documents/spez/hsd.pdf; ComponentLink5Description: Webshop / RFQ; ComponentLink5URL: http://www.rosenberger.com/en/contact/sales/
footprint ROS-D4S20L-40MA5-D_V (HSD Right Angle Plug, Edge Mount Pin in Paste, 27.3x12x6.95mm, Rosenberger Recommended)
pins: 1, 2, 3, 4, MH
text: Pair A; Pair B

## D4S20L-40MA5-D-RECEIVER
designator P?
HSD Right Angle Plug, Edge Mount Pin in Paste, Coding D (Bordeaux), Up to 5 GBit/s Per Pair, Receiver Side; PartNumber: D4S20L-40MA5-D-RECEIVER; Design Note 1: Footprint in library is a generic example - only application specific footprint delivers High Performance; Design Note 2: A HSD 1-to-1 connection always needs an Emitter AND Receiver symbol, because the cable has a A->B direction, the pinning must be crossed.; DatasheetVersion: d00; PackageVersion: d00; PackageReference: D4S20L-40MA5-D; PackageDescription: HSD Right Angle Plug, Edge Mount Pin in Paste, 27.3 x 12 x 6.95 mm; Coding: D (Bordeaux); Mounting Technology: Pin-in-Paste; ComponentLink1Description: Manufacturer URL; ComponentLink1URL: http://www.rosenberger.de; ComponentLink2Description: Datasheet; ComponentLink2URL: http://rosenberger.de/ok/images/documents/db/D4S20L-40MA5-Y.pdf; ComponentLink3Description: Package Specification; ComponentLink3URL: http://rosenberger.de/ok/images/documents/db/D4S20L-40MA5-Y.pdf; ComponentLink4Description: Series Overview / Design Note; ComponentLink4URL: http://rosenberger.de/ok/images/documents/spez/hsd.pdf; ComponentLink5Description: Webshop / RFQ; ComponentLink5URL: http://www.rosenberger.com/en/contact/sales/
footprint ROS-D4S20L-40MA5-D_V (HSD Right Angle Plug, Edge Mount Pin in Paste, 27.3x12x6.95mm, Rosenberger Recommended)
pins: 1, 2, 3, 4, MH
text: Pair A; Pair B

## D4S20L-40MA5-E-EMITTER
designator P?
HSD Right Angle Plug, Edge Mount Pin in Paste, Coding E (Green), Up to 5 GBit/s Per Pair, Emitter Side; PartNumber: D4S20L-40MA5-E-EMITTER; Design Note 1: Footprint in library is a generic example - only application specific footprint delivers High Performance; Design Note 2: A HSD 1-to-1 connection always needs an Emitter AND Receiver symbol, because the cable has a A->B direction, the pinning must be crossed.; DatasheetVersion: d00; PackageVersion: d00; PackageReference: D4S20L-40MA5-E; PackageDescription: HSD Right Angle Plug, Edge Mount Pin in Paste, 27.3 x 12 x 6.95 mm; Coding: E (Green); Mounting Technology: Pin-in-Paste; ComponentLink1Description: Manufacturer URL; ComponentLink1URL: http://www.rosenberger.de; ComponentLink2Description: Datasheet; ComponentLink2URL: http://rosenberger.de/ok/images/documents/db/D4S20L-40MA5-Y.pdf; ComponentLink3Description: Package Specification; ComponentLink3URL: http://rosenberger.de/ok/images/documents/db/D4S20L-40MA5-Y.pdf; ComponentLink4Description: Series Overview / Design Note; ComponentLink4URL: http://rosenberger.de/ok/images/documents/spez/hsd.pdf; ComponentLink5Description: Webshop / RFQ; ComponentLink5URL: http://www.rosenberger.com/en/contact/sales/
footprint ROS-D4S20L-40MA5-E_V (HSD Right Angle Plug, Edge Mount Pin in Paste, 27.3x12x6.95mm, Rosenberger Recommended)
pins: 1, 2, 3, 4, MH
text: Pair A; Pair B